# Altium footprint library NIXIEClock_PCB_V3.11.PcbLib: 45 footprints (part 3 of 3)
Each footprint in its own frame and in the unit in brackets; x right, y up, seen from the top. Pads: shape width x height; smd on the part's side, far side on the other; paste and mask are expansions set on the pad; w line width, h text height; cw(c..) or ccw(c..) is an arc to the next point about the centre after c.
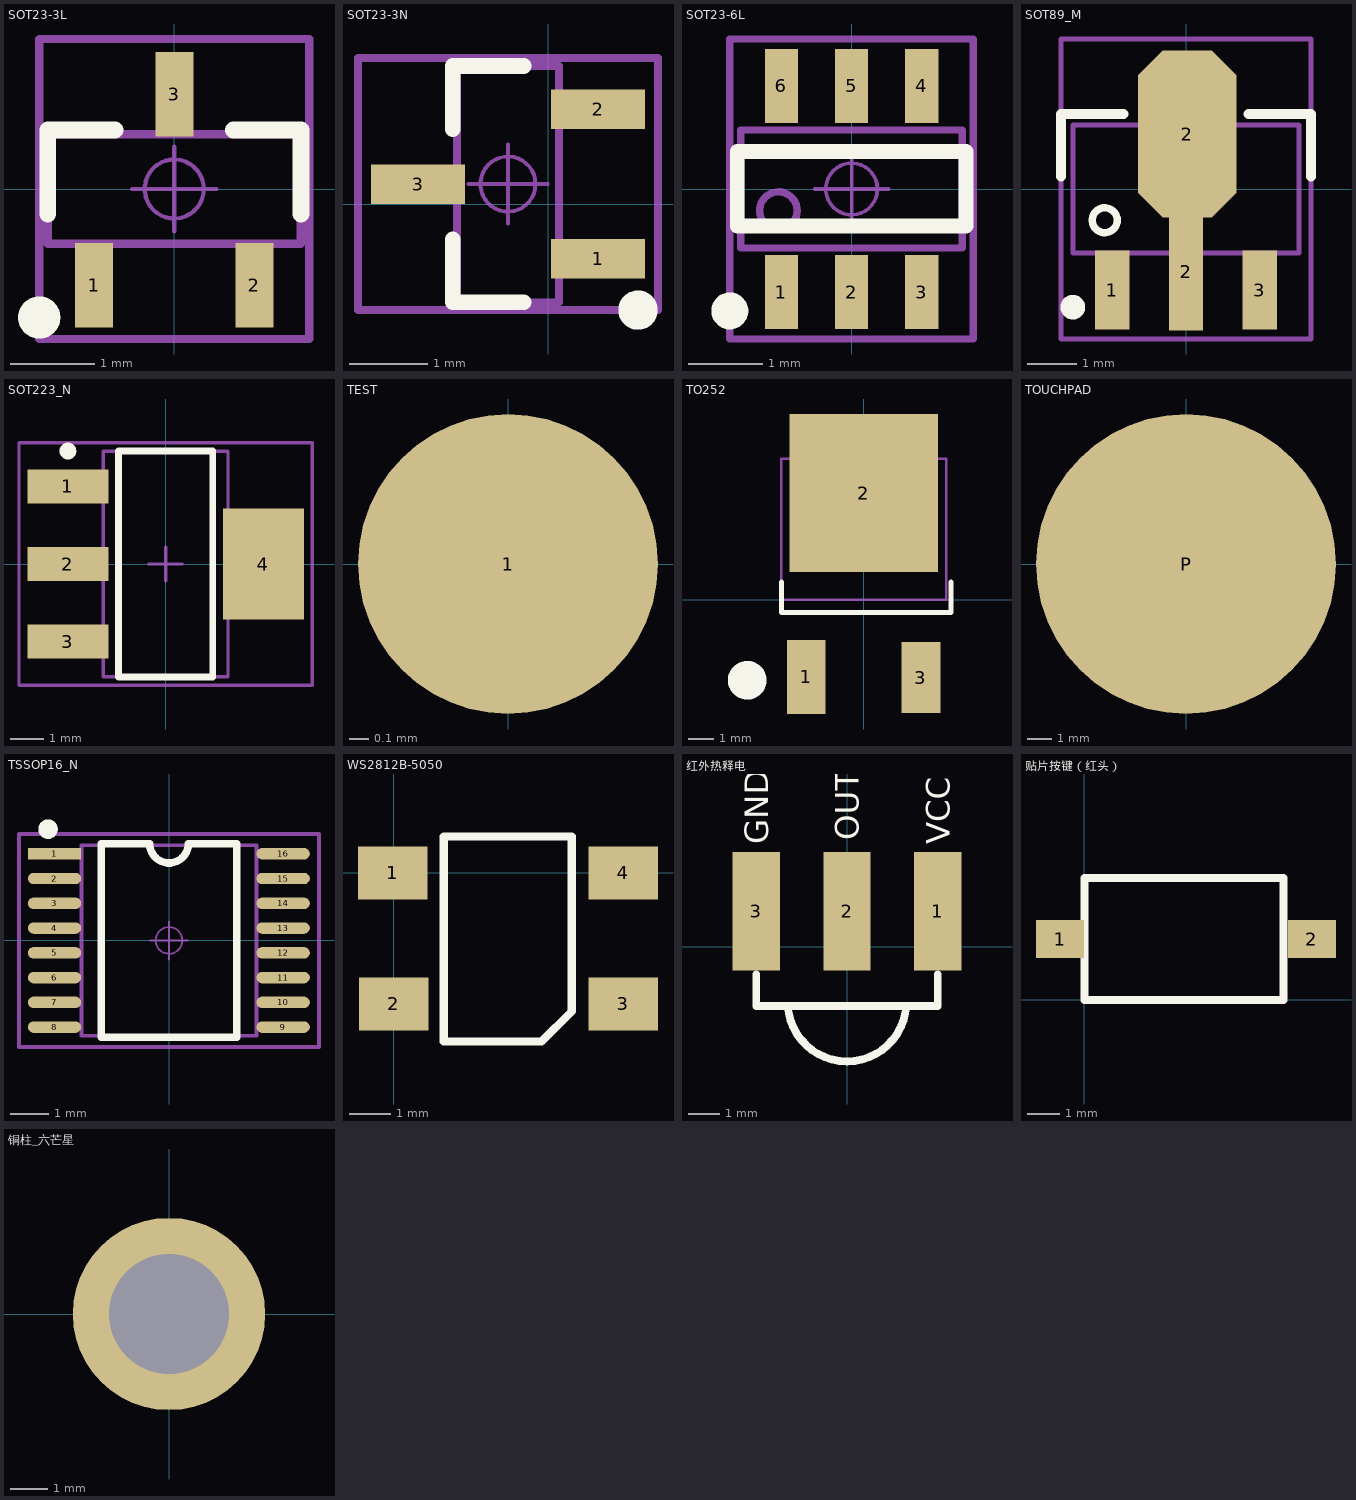
[diagram p2: the footprints below, top view; thin cyan lines are the x and y axes]

## SOT23-3L [mm] "3x1.3x1mm(长宽高)"
height 1.1
pads (3):
  rect 0.45x1 smd: 1(-0.95,-1.143) 2(0.95,-1.143) 3(0,1.125)
Top Overlay:
  circle w0.25: c-1.6,-1.524 r0.125
  lines w0.2: -1.5,-0.3 -1.5,0.7 -0.7,0.7 ; 0.7,0.7 1.5,0.7 1.5,-0.3
Mechanical 13:
  lines w0.1: -1.5,-0.65 -1.5,0.65 1.5,0.65 1.5,-0.65 -1.5,-0.65
Mechanical 15:
  circle w0.05: c0,0 r0.35
  lines w0.05: -0.5,0 0.5,0 ; 0,-0.5 0,0.5
  lines w0.1: -1.6,-1.778 -1.6,1.778 1.6,1.778 1.6,-1.778 -1.6,-1.778
3D body "SOT23-3.STEP": height 1.05, standoff 0, extent -1.5,-1.2 1.5,1.2

## SOT23-3N [mm]
height 1.6
pads (3):
  rect 1.2x0.5 smd: 1(0.635,-0.696) 2(0.635,1.204) 3(-1.651,0.254)
Top Overlay:
  circle w0.25: c1.143,-1.346 r0.125
  lines w0.2: -1.208,-0.447 -1.208,-1.247 -0.308,-1.247 ; -1.208,0.953 -1.208,1.753 -0.308,1.753
Mechanical 13:
  lines w0.1: -1.158,-1.246 -1.158,1.754 0.142,1.754 0.142,-1.246 -1.158,-1.246
Mechanical 15:
  circle w0.05: c-0.508,0.254 r0.35
  lines w0.05: -1.008,0.254 -0.008,0.254 ; -0.508,-0.246 -0.508,0.754
  lines w0.1: -2.413,-1.346 -2.413,1.854 1.397,1.854 1.397,-1.346 -2.413,-1.346
3D body "SOT23-3.STEP": height 1.05, standoff 0, extent -1.708,-1.246 0.692,1.754

## SOT23-6L [mm]
pads (6):
  rect 0.45x1 smd: 1(-0.95,-1.397) 2(0,-1.397) 3(0.95,-1.397) 4(0.95,1.397) 5(0,1.397) 6(-0.95,1.397)
Top Overlay:
  circle w0.25: c-1.65,-1.651 r0.125
  lines w0.2: -1.55,-0.5 -1.55,0.508 1.55,0.508 1.55,-0.5 -1.55,-0.5
Mechanical 13:
  circle w0.1: c-0.992,-0.292 r0.254
  lines w0.1: -1.5,-0.8 1.5,-0.8 1.5,0.8 -1.5,0.8 -1.5,-0.8
Mechanical 15:
  circle w0.05: c0,0 r0.35
  lines w0.05: -0.5,0 0.5,0 ; 0,-0.5 0,0.5
  lines w0.1: -1.65,-2.032 1.65,-2.032 1.65,2.032 -1.65,2.032 -1.65,-2.032
3D body "SOT23-6.STEP": height 1.15, standoff -0.03, extent -1.5,-1.404 1.5,1.403

## SOT89_M [mm] "4.6x4.3x1.6mm(长宽高)"
height 1.6
pads (4):
  rect 0.7x1.6 smd: 1(-1.5,-2.054) 3(1.5,-2.054)
  rect 0.7x2.4 smd: 2(0,-1.676)
  oct 2x3.4 smd: 2(0.025,1.118)
Top Overlay:
  circle w0.15: c-1.651,-0.635 r0.254
  circle w0.25: c-2.3,-2.4 r0.125
  lines w0.2: -2.54,0.254 -2.54,1.524 -1.27,1.524 ; 1.27,1.524 2.54,1.524 2.54,0.254
Mechanical 13:
  circle w0.1: c-1.651,-0.635 r0.25
  lines w0.1: -2.3,-1.3 -2.3,1.3 2.3,1.3 2.3,-1.3 -2.3,-1.3
Mechanical 15:
  circle w0.05: c0,0 r0.35
  lines w0.05: -0.5,0 0.5,0 ; 0,-0.5 0,0.5
  lines w0.1: -2.54,-3.048 2.54,-3.048 2.54,3.048 -2.54,3.048 -2.54,-3.048
3D body "SOT89.STEP": height 1.6, standoff 0.04, extent -2.3,-2.4 2.3,1.9

## SOT223_N [mm] "SOT223, 4-Leads, Body 6.5x3.5mm, Pitch 2.3mm, Lead Span 7mm, IPC Medium Density"
height 1.7
pads (4):
  rect 2.4x1 smd: 1(-2.9,2.3) 2(-2.9,0) 3(-2.9,-2.3)
  rect 2.4x3.3 smd: 4(2.9,0)
Top Overlay:
  circle w0.25: c-2.9,3.35 r0.125
  lines w0.2: -1.4,-3.35 1.4,-3.35 1.4,3.35 -1.4,3.35 -1.4,-3.35
Mechanical 13:
  lines w0.1: -1.85,-3.35 1.85,-3.35 1.85,3.35 -1.85,3.35 -1.85,-3.35
Mechanical 15:
  lines w0.1: -0.5,0 0.5,0 ; 0,-0.5 0,0.5 ; -4.35,-3.6 4.35,-3.6 4.35,3.6 -4.35,3.6 -4.35,-3.6
3D body: height 1.7, standoff 0, extent -1.85,-3.35 1.85,3.35

## TEST [mil]
pads (1):
  round 60 smd: 1(0,0)

## TO252 [mil]
pads (3):
  rect 60x115 smd: 1(-89.55,-119.77)
  rect 230x245 smd: 2(0,165.35)
  rect 60x110 smd: 3(88.45,-120.77)
Top Overlay:
  circle w30: c-180.86,-125 r15
  lines w7.87: -127.95,27.56 -127.95,-20 135,-20 135,27.56
Mechanical 15:
  lines w3.94: -105.04,218.5 -105.04,236.06 -65.59,271.65 65.59,271.65 105.04,236.06 105.04,218.5 ; -127.95,0 127.95,0 127.95,218.5 -127.95,218.5 -127.95,0
3D body "TO252.STEP": height 90.55, standoff -0.2, extent -126.95,-120.29 128.95,250.55

## TOUCHPAD [mm]
pads (1):
  round 12.3 smd mask+0.102: P(0,0)
Top Solder:
  circle w0.203: c0,0 r6
  circle w0.203: c0,0 r5.5
  lines w0.203: -5.182,-2.972 -5.182,-3 ; -5.105,3 -5.182,3 5.182,3 0,-6 -5.083,2.953 ; 5.057,-2.913 0,6 -5.083,-3 -5.134,-3 -5.182,-3 ; 5.207,-3 -5.182,-3

## TSSOP16_N [mm] "5*6.4*1mm（长宽高）"
height 1.6
pads (16):
  rect 1.4x0.3 smd: 1(-3.004,2.275)
  oval 1.4x0.3 smd: 2(-3.004,1.625) 3(-3.004,0.975) 4(-3.004,0.325) 5(-3.004,-0.325) 6(-3.004,-0.975) 7(-3.004,-1.625) 8(-3.004,-2.275) 9(2.996,-2.275) 10(2.996,-1.625) 11(2.996,-0.975) 12(2.996,-0.325) 13(2.996,0.325) 14(2.996,0.975) 15(2.996,1.625) 16(2.996,2.275)
Top Overlay:
  circle w0.254: c-3.175,2.921 r0.13
  lines w0.2: -1.778,-2.54 1.778,-2.54 1.778,2.54 0.508,2.54 cw(c0,2.54) -0.508,2.54 -1.778,2.54 -1.778,-2.54
Mechanical 13:
  lines w0.1: -2.3,-2.5 2.3,-2.5 2.3,2.5 -2.3,2.5 -2.3,-2.5
Mechanical 15:
  circle w0.05: c0,0 r0.35
  lines w0.05: -0.5,0 0.5,0 ; 0,-0.5 0,0.5
  lines w0.1: -3.937,-2.794 -3.937,2.794 3.937,2.794 3.937,-2.794 -3.937,-2.794
3D body "TSSOP16.STEP": height 1.03, standoff -0.02, extent -3.202,-2.5 3.202,2.5

## WS2812B-5050 [mm]
pads (4):
  rect 1.7x1.3 smd: 1(-0.025,0) 2(0,-3.2) 3(5.6,-3.2) 4(5.6,0)
Top Overlay:
  lines w0.2: 1.219,-4.115 1.219,0.889 4.343,0.889 4.343,-3.378 3.607,-4.115 1.219,-4.115

## 红外热释电 [mil] "一体红外接收头"
pads (3):
  rect 60x150 smd: 1(115,45) 2(0,45) 3(-115,45)
Top Overlay:
  lines w10: -115,-35 -115,-75 115,-75 115,-35 ; -75,-75 ccw(c0,-70) 75,-75
  text "OUT" at 15,135 h30
  text "VCC" at 130,130 h30
  text "GND" at -100,130 h30

## 贴片按键（红头） [mm]
pads (2):
  rect 1.5x1.2 smd: 1(-0.762,1.905) 2(7.112,1.905)
Top Overlay:
  lines w0.254: 0,0 6.223,0 6.223,3.81 0,3.81 0,0

## 铜柱_六芒星 [mm]
pads (1):
  round 5.08 hole 3.175: ""(0,0)
Top Solder:
  circle w0.127: c0,0 r3.961
  circle w0.127: c0,0 r2.736
  lines w0.127: 1.023,-3.817 -3.817,-1.023 -1.023,3.817 3.817,1.023 1.024,-3.815 ; -3.817,1.023 1.023,3.817 3.817,-1.023 -1.023,-3.817 -3.817,1.023 ; -2.794,-2.794 2.794,-2.794 2.794,2.794 -2.794,2.794 -2.794,-2.794
3D body "M3x11.STEP": height 11.05, standoff 0.05, extent -2.698,-2.35 2.698,2.35